# Altium footprint library Metric_Thru_Hole.PcbLib: 91 footprints (part 1 of 6)
Each footprint in its own frame and in the unit in brackets; x right, y up, seen from the top. Pads: shape width x height; smd on the part's side, far side on the other; paste and mask are expansions set on the pad; w line width, h text height; cw(c..) or ccw(c..) is an arc to the next point about the centre after c.
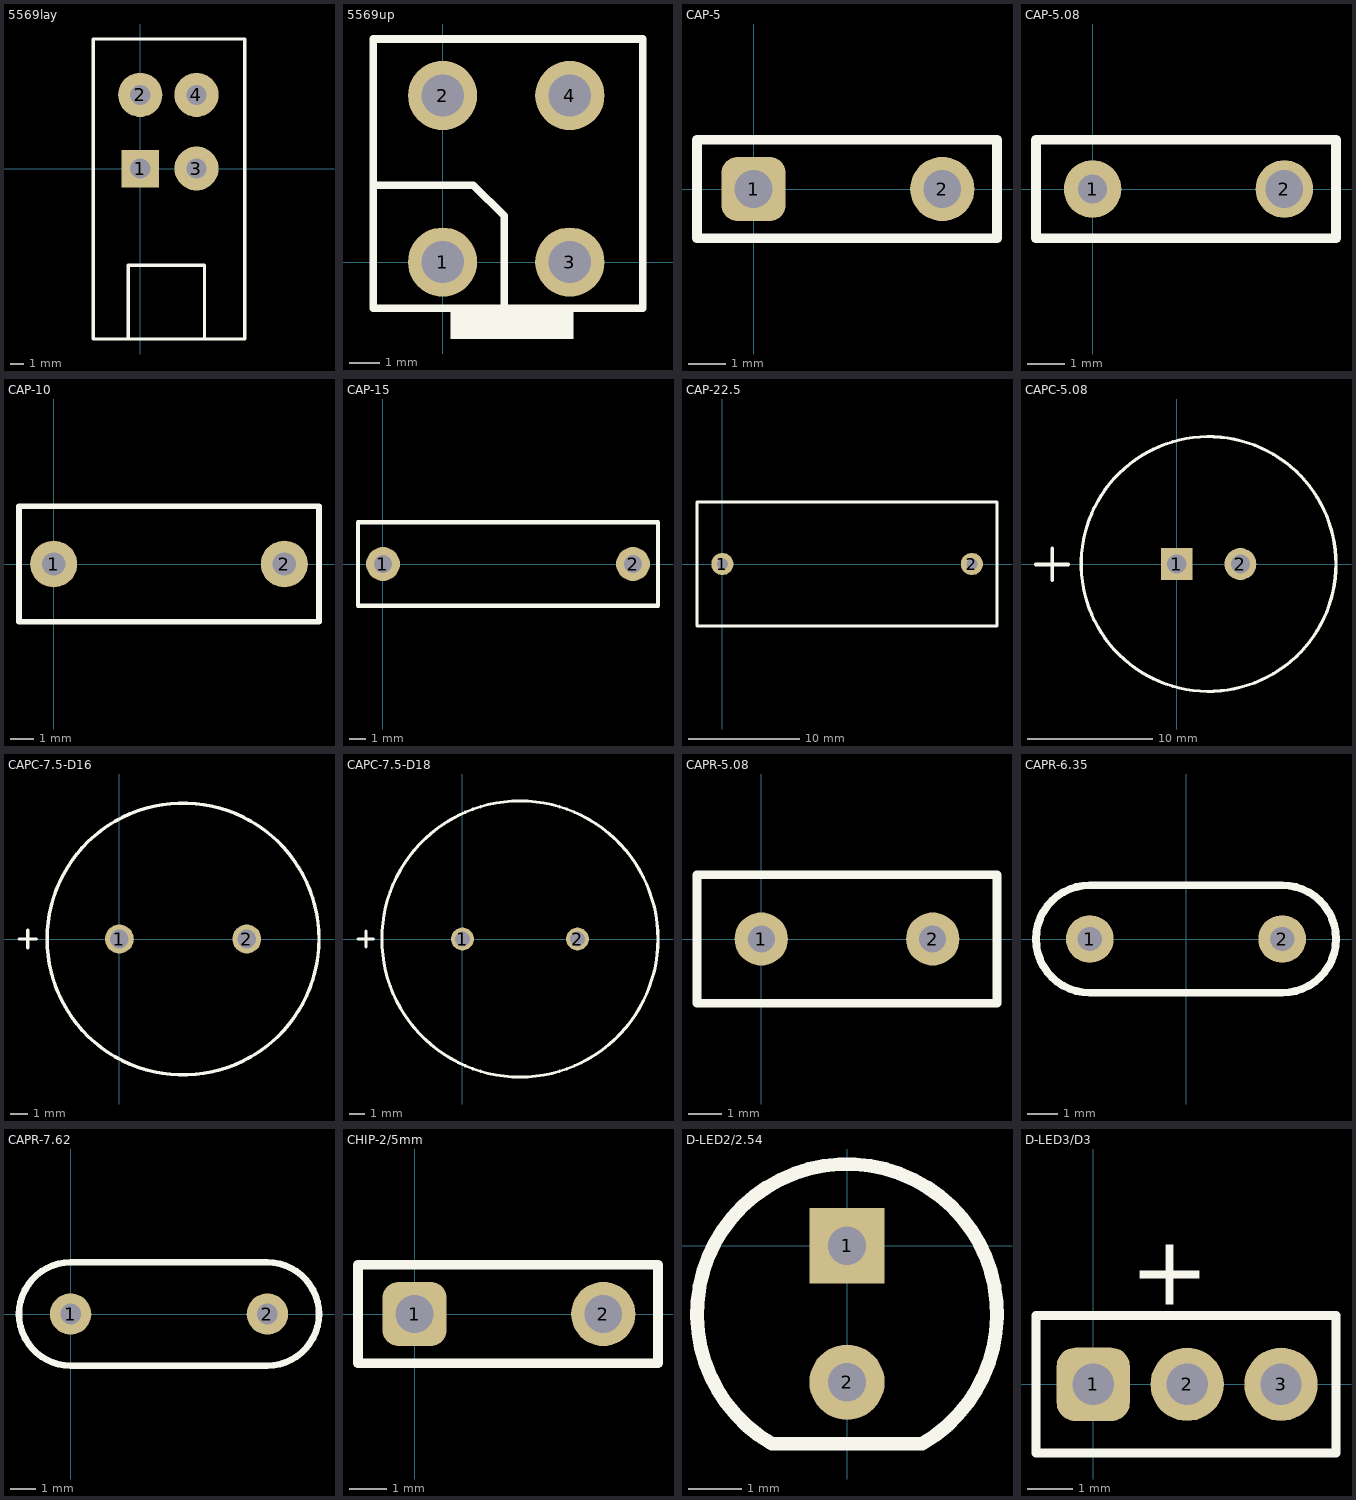
[diagram p0: the footprints below, top view; thin cyan lines are the x and y axes]

## 5569lay [mm] "5557,5569间距4.2mm"
height 10
pads (4):
  rect 2.8x2.8 hole 1.5: 1(0,0)
  round 3.3 hole 1.5: 2(0,5.5) 3(4.2,0) 4(4.2,5.5)
Top Overlay:
  lines w0.254: -0.9,-12.73 -0.9,-7.23 4.8,-7.23 4.8,-12.73 ; -3.5,-12.73 -3.5,9.67 0,9.67 4.5,9.67 7.8,9.67 7.8,-12.73 4.2,-12.73 0,-12.73 -3.5,-12.73
3D body: height 5, standoff 4, extent -0.416,-12.8 0.4,-0.314
3D body: height 5, standoff 0, extent -0.416,-0.41 0.4,0.4
3D body: height 5, standoff 0, extent 3.884,-0.41 4.7,0.4
3D body: height 5, standoff 4, extent 3.884,-12.9 4.7,-0.314
3D body: height 8, standoff 0, extent -0.416,5.09 0.4,5.9
3D body: height 8, standoff 0, extent 3.884,5.09 4.7,5.9
3D body: height 8, standoff 7, extent 3.884,-12.9 4.7,5.786
3D body: height 8, standoff 7, extent -0.416,-12.8 0.4,5.586
3D body: height 10.5, standoff 0.1, extent -3.5,-12.65 7.5,-1.85

## 5569up [mil] "间距4.2mm"
pads (4):
  round 90 hole 55: 1(0,0) 2(0,216.54) 3(165.35,0) 4(165.35,216.54)
Top Overlay:
  rectangle: 10,-100 170,-60
  lines w10: -90,100 40,100 80,60 80,-60 ; -90,-60 260,-60 260,290 -90,290 -90,-60
3D body: height 472.44, standoff 3.94, extent -90.55,-59.06 255.91,287.4

## CAP-5 [mm] "片式元件5mm间距,高9mm"
height 9
pads (2):
  rrect50% 1.7x1.7 hole 1: 1(0,0)
  round 1.7 hole 1: 2(5,0)
Top Overlay:
  lines w0.254: -1.5,-1.3 -1.5,1.3 6.45,1.3 6.45,-1.3 -1.5,-1.3
3D body: height 10.49, standoff 1.51, extent -1.865,0 7.1,0.2
3D body: height 2.97, standoff -0.02, extent 4.45,-0.05 5.167,0.15
3D body: height 2.97, standoff -0.02, extent -0.122,-0.05 0.595,0.15
3D body: height 8, standoff 4, extent 0.608,-0.35 4.592,0.45
3D body: height 9.24, standoff 2.76, extent -0.574,-0.15 5.9,0.35

## CAP-5.08 [mil] "片式元件5.08mm间距,高9.3mm"
height 366.14
pads (2):
  round 60 hole 30: 1(0,0)
  round 60 hole 39.37: 2(200,0)
Top Overlay:
  lines w10: -59.06,-51.18 -59.06,51.18 253.94,51.18 253.94,-51.18 -59.06,-51.18
3D body: height 413.04, standoff 59.4, extent -73.41,0 279.53,7.87
3D body: height 116.99, standoff -0.68, extent 175.2,-1.96 203.43,5.9
3D body: height 116.99, standoff -0.68, extent -4.79,-1.95 23.44,5.91
3D body: height 314.81, standoff 157.64, extent 23.93,-13.78 180.79,17.72
3D body: height 363.92, standoff 108.52, extent -22.61,-5.91 232.28,13.78

## CAP-10 [mil] "长*宽为13*5"
height 433.07
pads (2):
  round 80 hole 40: 1(0,0) 2(393.7,0)
Top Overlay:
  lines w10: -59.06,-98.43 -59.06,98.43 452.76,98.43 452.76,-98.43 -59.06,-98.43
3D body "User Library-final MOV7,5.STEP": height 531.5, standoff -196.85, extent -24.12,-35.83 420.12,37

## CAP-15 [mil] "长*宽*高为18*5"
height 413.39
pads (2):
  round 80 hole 43.31: 1(0,0) 2(590.55,0)
Top Overlay:
  lines w10: -59.06,-98.43 -59.06,98.43 649.61,98.43 649.61,-98.43 -59.06,-98.43

## CAP-22.5 [mm]
pads (2):
  round 2 hole 1: 1(0,0) 2(22.5,0)
Top Overlay:
  lines w0.254: -2.286,-5.588 24.765,-5.588 24.765,5.588 -2.286,5.588 -2.286,-5.588
3D body "SW3dPS-ECQE(F) 0.47uf 630Vdc 250Vac.STEP": height 20.5, standoff -3, extent -1.824,-4.728 24.176,4.572

## CAPC-5.08 [mil] "超级电容直插封装,直径800mil,pitch=200mil"
height 118.11
pads (2):
  rect 100x100 hole 60: 1(0,0)
  round 100 hole 60: 2(200,0)
Top Overlay:
  circle w10: c100,0 r400
  lines w12: -442,-2 -342,-2 ; -391,-51 -391,49
3D body: height 220, standoff 20, extent -306.64,-408.27 490.2,390.15

## CAPC-7.5-D16 [mm] "Body Dia. 16mm,Lead space 7.5mm"
pads (2):
  round 1.7 hole 1.1: 1(0,0) 2(7.5,0)
Top Overlay:
  circle w0.2: c3.75,0 r8
  lines w0.2: -5.903,0 -4.887,0 ; -5.395,-0.508 -5.395,0.508

## CAPC-7.5-D18 [mm] "Body Dia. 18mm,Lead space 7.5mm"
pads (2):
  round 1.5 hole 1: 1(0,0) 2(7.5,0)
Top Overlay:
  circle w0.2: c3.75,0 r9
  lines w0.2: -6.808,0 -5.792,0 ; -6.3,-0.508 -6.3,0.508

## CAPR-5.08 [mil]
pads (2):
  round 62 hole 31.5: 1(0,0) 2(200,0)
Top Overlay:
  lines w10: -75,-75 -75,75 275,75 275,-75 -75,-75

## CAPR-6.35 [mil]
pads (2):
  round 62 hole 31.5: 1(-125,0) 2(125,0)
Top Overlay:
  lines w10: -125,-70 cw(c-125,0) -125,70 125,70 cw(c125,0) 125,-70 -125,-70

## CAPR-7.62 [mm]
pads (2):
  round 1.6 hole 0.8: 1(0,0) 2(7.62,0)
Top Overlay:
  lines w0.254: 0,-2 cw(c0,0) 0,2 7.62,2 cw(c7.62,0) 7.62,-2 0,-2

## CHIP-2/5mm [mm]
height 9
pads (2):
  rrect50% 1.7x1.7 hole 1: 1(0,0)
  round 1.7 hole 1: 2(5,0)
Top Overlay:
  lines w0.254: -1.5,-1.3 -1.5,1.3 6.45,1.3 6.45,-1.3 -1.5,-1.3
3D body: height 2.97, standoff -0.02, extent -0.122,-0.05 0.595,0.15
3D body: height 2.97, standoff -0.02, extent 4.45,-0.05 5.167,0.15
3D body: height 10.49, standoff 1.51, extent -1.865,0 7.1,0.2
3D body: height 9.24, standoff 2.76, extent -0.574,-0.15 5.9,0.35
3D body: height 8, standoff 4, extent 0.608,-0.35 4.592,0.45

## D-LED2/2.54 [mm] "直插LED, 2.54mm脚距"
pads (2):
  rect 1.4x1.4 hole 0.711: 1(0,0)
  round 1.4 hole 0.711: 2(0,-2.54)
Top Overlay:
  lines w0.254: -1.397,-3.69 cw(c0,-1.27) 1.397,-3.69 -1.397,-3.69
3D body "User Library-led 5mm green.STEP": height 9.16, standoff -27.67, extent -2.999,-3.97 2.999,1.73

## D-LED3/D3 [mm] "插装LED,直径3mm"
height 6
pads (3):
  rrect50% 1.6x1.6 hole 0.9: 1(0,0)
  round 1.6 hole 0.9: 2(2.05,0) 3(4.1,0)
Top Overlay:
  lines w0.2: -1.25,-1.5 -1.25,1.5 5.3,1.5 5.3,-1.5 -1.25,-1.5
  text "+" at 2.54,3.048 h1.52
3D body: height 2.03, standoff 0, extent 1.747,-0.3 2.253,0.207
3D body: height 5.08, standoff 2.03, extent 0.618,-1.55 3.65,1.485
3D body: height 5.08, standoff 2.03, extent 0.45,-1.55 3.482,1.485
3D body: height 3.56, standoff 2.03, extent 0.463,-1.65 3.65,1.544
3D body: height 2.03, standoff 0, extent 0.247,-0.25 0.753,0.257
3D body: height 2.03, standoff 0, extent 3.4,-0.203 3.906,0.303